# Altium footprint library Supernova Connectors.PcbLib: 303 footprints (part 11 of 19)
Each footprint in its own frame and in the unit in brackets; x right, y up, seen from the top. Pads: shape width x height; smd on the part's side, far side on the other; paste and mask are expansions set on the pad; w line width, h text height; cw(c..) or ccw(c..) is an arc to the next point about the centre after c.
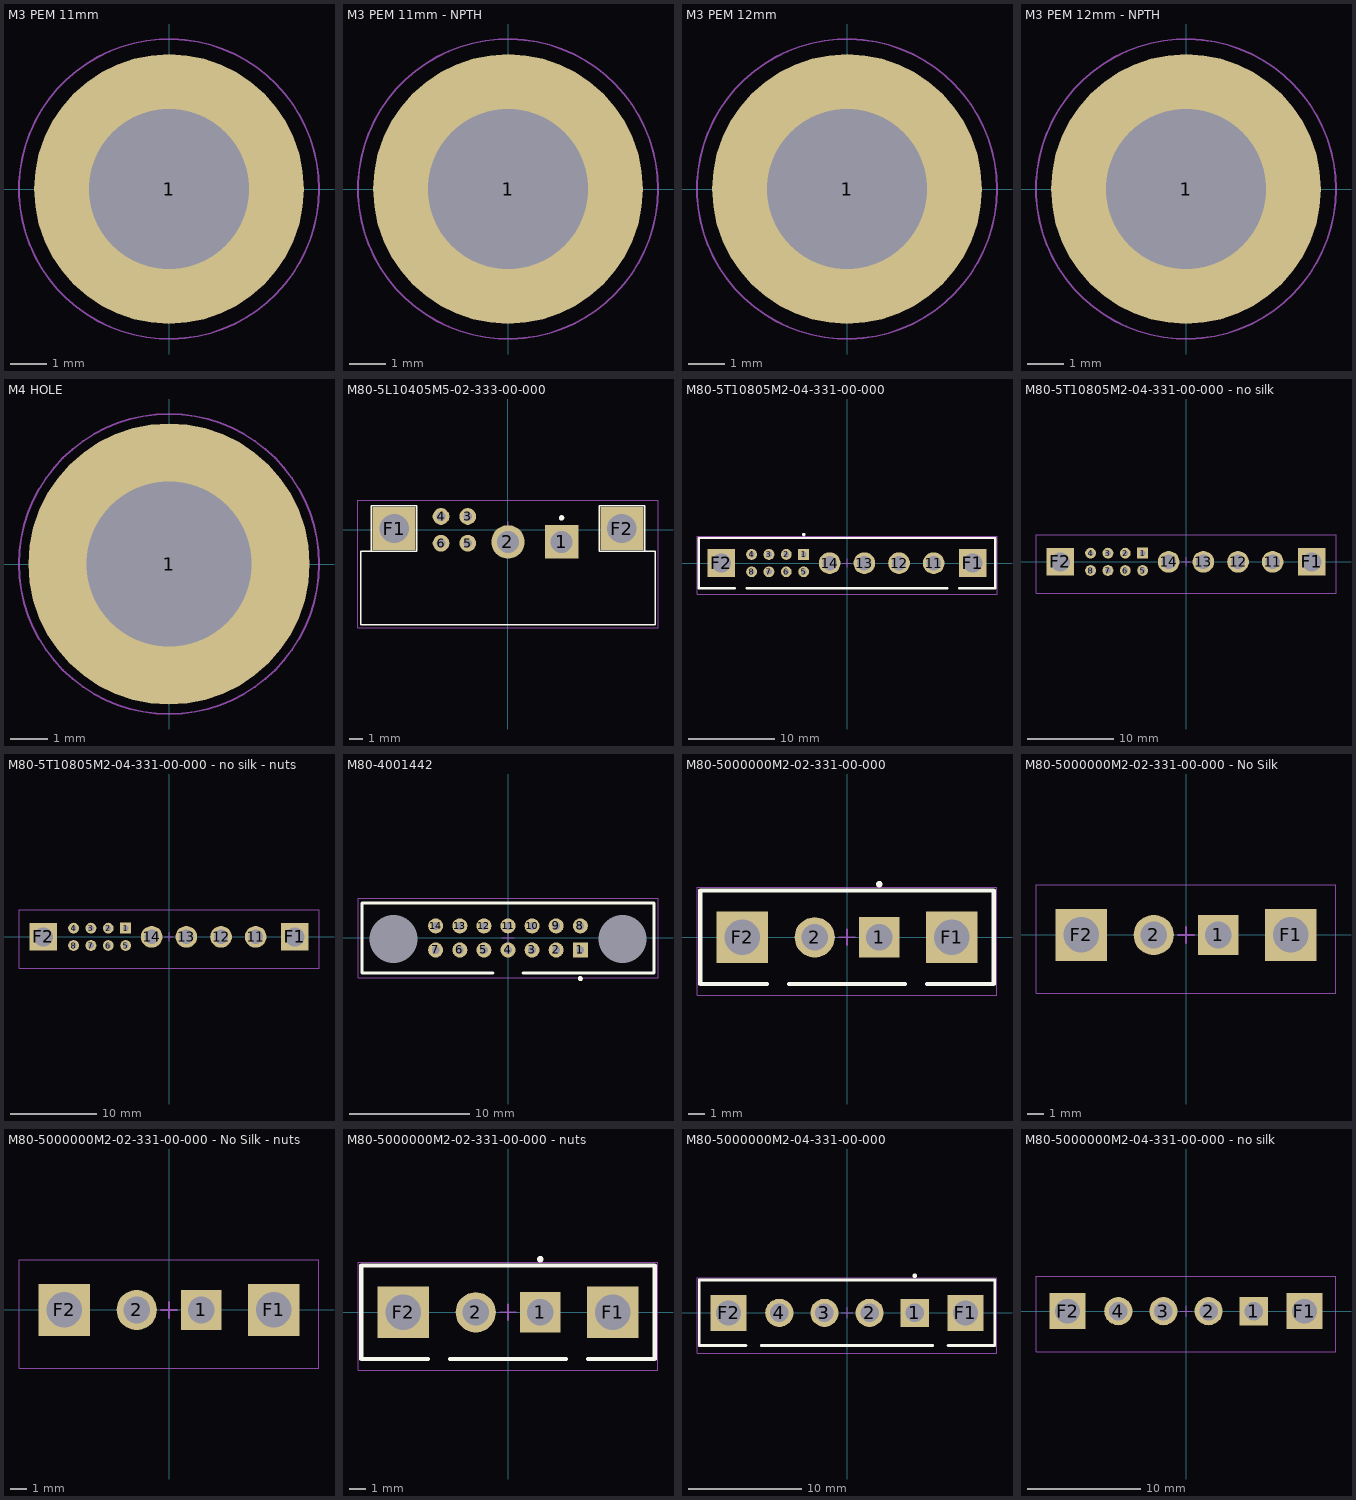
[diagram p10: the footprints below, top view; thin cyan lines are the x and y axes]

## M3 PEM 11mm [mm]
pads (1):
  round 7.4 / inner round 0 / far side round 5 hole 4.4: 1(0,0)
Top Paste:
  region: 0.4,-3.598 0.4,-2.217 0.398,-2.204 0.563,-2.168 0.884,-2.058 1.185,-1.901 1.459,-1.7 1.699,-1.46 1.9,-1.187 2.057,-0.887 2.167,-0.566 2.204,-0.4 3.613,-0.4 3.59,-0.603 3.5,-1.003 3.365,-1.389 3.188,-1.758 2.971,-2.105 2.716,-2.425 2.426,-2.715 2.106,-2.97 1.76,-3.187 1.391,-3.365 1.004,-3.5 0.605,-3.59 0.402,-3.613
  region: 3.598,0.4 2.217,0.4 2.204,0.398 2.168,0.563 2.058,0.884 1.901,1.185 1.7,1.459 1.46,1.699 1.187,1.9 0.887,2.057 0.566,2.167 0.4,2.204 0.4,3.613 0.603,3.59 1.003,3.5 1.389,3.365 1.758,3.188 2.105,2.971 2.425,2.716 2.715,2.426 2.97,2.106 3.187,1.76 3.365,1.391 3.5,1.004 3.59,0.605 3.613,0.402
  region: -0.4,3.598 -0.4,2.217 -0.398,2.204 -0.563,2.168 -0.884,2.058 -1.185,1.901 -1.459,1.7 -1.699,1.46 -1.9,1.187 -2.057,0.887 -2.167,0.566 -2.204,0.4 -3.613,0.4 -3.59,0.603 -3.5,1.003 -3.365,1.389 -3.188,1.758 -2.971,2.105 -2.716,2.425 -2.426,2.715 -2.106,2.97 -1.76,3.187 -1.391,3.365 -1.004,3.5 -0.605,3.59 -0.402,3.613
  region: -3.598,-0.4 -2.217,-0.4 -2.204,-0.398 -2.168,-0.563 -2.058,-0.884 -1.901,-1.185 -1.7,-1.459 -1.46,-1.699 -1.187,-1.9 -0.887,-2.057 -0.566,-2.167 -0.4,-2.204 -0.4,-3.613 -0.603,-3.59 -1.003,-3.5 -1.389,-3.365 -1.758,-3.188 -2.105,-2.971 -2.425,-2.716 -2.715,-2.426 -2.97,-2.106 -3.187,-1.76 -3.365,-1.391 -3.5,-1.004 -3.59,-0.605 -3.613,-0.402
Top Courtyard:
  circle w0.05: c0,0 r4.115
3D body "9774110360R (rev1).stp": height 11, standoff -1.4, extent -3,-3 3,3

## M3 PEM 11mm - NPTH [mm]
pads (1):
  round 7.4 / inner round 0 / far side round 0 hole 4.4 unplated: 1(0,0)
Top Paste:
  region: -3.598,-0.4 -2.217,-0.4 -2.204,-0.398 -2.168,-0.563 -2.058,-0.884 -1.901,-1.185 -1.7,-1.459 -1.46,-1.699 -1.187,-1.9 -0.887,-2.057 -0.566,-2.167 -0.4,-2.204 -0.4,-3.613 -0.603,-3.59 -1.003,-3.5 -1.389,-3.365 -1.758,-3.188 -2.105,-2.971 -2.425,-2.716 -2.715,-2.426 -2.97,-2.106 -3.187,-1.76 -3.365,-1.391 -3.5,-1.004 -3.59,-0.605 -3.613,-0.402
  region: -0.4,3.598 -0.4,2.217 -0.398,2.204 -0.563,2.168 -0.884,2.058 -1.185,1.901 -1.459,1.7 -1.699,1.46 -1.9,1.187 -2.057,0.887 -2.167,0.566 -2.204,0.4 -3.613,0.4 -3.59,0.603 -3.5,1.003 -3.365,1.389 -3.188,1.758 -2.971,2.105 -2.716,2.425 -2.426,2.715 -2.106,2.97 -1.76,3.187 -1.391,3.365 -1.004,3.5 -0.605,3.59 -0.402,3.613
  region: 3.598,0.4 2.217,0.4 2.204,0.398 2.168,0.563 2.058,0.884 1.901,1.185 1.7,1.459 1.46,1.699 1.187,1.9 0.887,2.057 0.566,2.167 0.4,2.204 0.4,3.613 0.603,3.59 1.003,3.5 1.389,3.365 1.758,3.188 2.105,2.971 2.425,2.716 2.715,2.426 2.97,2.106 3.187,1.76 3.365,1.391 3.5,1.004 3.59,0.605 3.613,0.402
  region: 0.4,-3.598 0.4,-2.217 0.398,-2.204 0.563,-2.168 0.884,-2.058 1.185,-1.901 1.459,-1.7 1.699,-1.46 1.9,-1.187 2.057,-0.887 2.167,-0.566 2.204,-0.4 3.613,-0.4 3.59,-0.603 3.5,-1.003 3.365,-1.389 3.188,-1.758 2.971,-2.105 2.716,-2.425 2.426,-2.715 2.106,-2.97 1.76,-3.187 1.391,-3.365 1.004,-3.5 0.605,-3.59 0.402,-3.613
Top Courtyard:
  circle w0.05: c0,0 r4.115
3D body "9774110360R (rev1).stp": height 11, standoff -1.4, extent -3,-3 3,3

## M3 PEM 12mm [mm]
pads (1):
  round 7.4 / inner round 0 / far side round 5 hole 4.4: 1(0,0)
Top Paste:
  region: 0.4,-3.598 0.4,-2.217 0.398,-2.204 0.563,-2.168 0.884,-2.058 1.185,-1.901 1.459,-1.7 1.699,-1.46 1.9,-1.187 2.057,-0.887 2.167,-0.566 2.204,-0.4 3.613,-0.4 3.59,-0.603 3.5,-1.003 3.365,-1.389 3.188,-1.758 2.971,-2.105 2.716,-2.425 2.426,-2.715 2.106,-2.97 1.76,-3.187 1.391,-3.365 1.004,-3.5 0.605,-3.59 0.402,-3.613
  region: 3.598,0.4 2.217,0.4 2.204,0.398 2.168,0.563 2.058,0.884 1.901,1.185 1.7,1.459 1.46,1.699 1.187,1.9 0.887,2.057 0.566,2.167 0.4,2.204 0.4,3.613 0.603,3.59 1.003,3.5 1.389,3.365 1.758,3.188 2.105,2.971 2.425,2.716 2.715,2.426 2.97,2.106 3.187,1.76 3.365,1.391 3.5,1.004 3.59,0.605 3.613,0.402
  region: -0.4,3.598 -0.4,2.217 -0.398,2.204 -0.563,2.168 -0.884,2.058 -1.185,1.901 -1.459,1.7 -1.699,1.46 -1.9,1.187 -2.057,0.887 -2.167,0.566 -2.204,0.4 -3.613,0.4 -3.59,0.603 -3.5,1.003 -3.365,1.389 -3.188,1.758 -2.971,2.105 -2.716,2.425 -2.426,2.715 -2.106,2.97 -1.76,3.187 -1.391,3.365 -1.004,3.5 -0.605,3.59 -0.402,3.613
  region: -3.598,-0.4 -2.217,-0.4 -2.204,-0.398 -2.168,-0.563 -2.058,-0.884 -1.901,-1.185 -1.7,-1.459 -1.46,-1.699 -1.187,-1.9 -0.887,-2.057 -0.566,-2.167 -0.4,-2.204 -0.4,-3.613 -0.603,-3.59 -1.003,-3.5 -1.389,-3.365 -1.758,-3.188 -2.105,-2.971 -2.425,-2.716 -2.715,-2.426 -2.97,-2.106 -3.187,-1.76 -3.365,-1.391 -3.5,-1.004 -3.59,-0.605 -3.613,-0.402
Top Courtyard:
  circle w0.05: c0,0 r4.115
3D body "9774120360R (rev1).stp": height 12, standoff -1.4, extent -3,-3 3,3

## M3 PEM 12mm - NPTH [mm]
pads (1):
  round 7.4 / inner round 0 / far side round 0 hole 4.4 unplated: 1(0,0)
Top Paste:
  region: -3.598,-0.4 -2.217,-0.4 -2.204,-0.398 -2.168,-0.563 -2.058,-0.884 -1.901,-1.185 -1.7,-1.459 -1.46,-1.699 -1.187,-1.9 -0.887,-2.057 -0.566,-2.167 -0.4,-2.204 -0.4,-3.613 -0.603,-3.59 -1.003,-3.5 -1.389,-3.365 -1.758,-3.188 -2.105,-2.971 -2.425,-2.716 -2.715,-2.426 -2.97,-2.106 -3.187,-1.76 -3.365,-1.391 -3.5,-1.004 -3.59,-0.605 -3.613,-0.402
  region: -0.4,3.598 -0.4,2.217 -0.398,2.204 -0.563,2.168 -0.884,2.058 -1.185,1.901 -1.459,1.7 -1.699,1.46 -1.9,1.187 -2.057,0.887 -2.167,0.566 -2.204,0.4 -3.613,0.4 -3.59,0.603 -3.5,1.003 -3.365,1.389 -3.188,1.758 -2.971,2.105 -2.716,2.425 -2.426,2.715 -2.106,2.97 -1.76,3.187 -1.391,3.365 -1.004,3.5 -0.605,3.59 -0.402,3.613
  region: 3.598,0.4 2.217,0.4 2.204,0.398 2.168,0.563 2.058,0.884 1.901,1.185 1.7,1.459 1.46,1.699 1.187,1.9 0.887,2.057 0.566,2.167 0.4,2.204 0.4,3.613 0.603,3.59 1.003,3.5 1.389,3.365 1.758,3.188 2.105,2.971 2.425,2.716 2.715,2.426 2.97,2.106 3.187,1.76 3.365,1.391 3.5,1.004 3.59,0.605 3.613,0.402
  region: 0.4,-3.598 0.4,-2.217 0.398,-2.204 0.563,-2.168 0.884,-2.058 1.185,-1.901 1.459,-1.7 1.699,-1.46 1.9,-1.187 2.057,-0.887 2.167,-0.566 2.204,-0.4 3.613,-0.4 3.59,-0.603 3.5,-1.003 3.365,-1.389 3.188,-1.758 2.971,-2.105 2.716,-2.425 2.426,-2.715 2.106,-2.97 1.76,-3.187 1.391,-3.365 1.004,-3.5 0.605,-3.59 0.402,-3.613
Top Courtyard:
  circle w0.05: c0,0 r4.115
3D body "9774120360R (rev1).stp": height 12, standoff -1.4, extent -3,-3 3,3

## M4 HOLE [mm]
pads (1):
  round 7.5 / inner round 5 / far side round 7.5 hole 4.4: 1(0,0)
Top Courtyard:
  circle w0.05: c0,0 r4

## M80-5L10405M5-02-333-00-000 [mm]
pads (8):
  rect 2.5x2.5 hole 1.65: 1(4,-0.9)
  round 2.5 hole 1.65: 2(0,-0.9)
  round 1.25 hole 0.65 paste+0: 3(-3,1) 4(-5,1) 5(-3,-1) 6(-5,-1)
  rect 3.2x3.2 / inner round 4 / far side round 4 hole 2.2 paste+0 mask+0: F1(-8.5,0.1) F2(8.5,0.1)
Top Overlay:
  circle w0.203: c4,0.895 r0.102
  lines w0.1: -10.207,-1.591 -10.207,1.787 -10.028,1.787 -6.803,1.787 -6.803,-1.591 -7.032,-1.591 -9.937,-1.591 -10.991,-1.591 -10.991,-7.1 10.991,-7.1 10.991,-1.591 9.937,-1.591 7.032,-1.591 6.803,-1.591 6.803,1.787 10.028,1.787 10.207,1.787 10.207,-1.591
Top Courtyard:
  lines w0.05: -11.2,-7.3 11.2,-7.3 11.2,2.2 -11.2,2.2 -11.2,-7.3
  lines w0.1: -0.5,0.1 0.5,0.1 ; 0,-0.4 0,0.6
3D body "m80-5l10405m5-02-333-00-000_asm.stp": height 6.05, standoff -3.67, extent -11,-7 11,2.05

## M80-5T10805M2-04-331-00-000 [mm]
pads (14):
  rect 1.25x1.25 hole 0.65 paste+0: 1(-5,1)
  round 1.25 hole 0.65 paste+0: 2(-7,1) 3(-9,1) 4(-11,1) 5(-5,-1) 6(-7,-1) 7(-9,-1) 8(-11,-1)
  round 2.5 hole 1.65: 11(10,0) 12(6,0) 13(2,0) 14(-2,0)
  rect 3.2x3.2 / inner round 4 / far side round 4 hole 2.2 paste+0 mask+0: F1(14.5,0) F2(-14.5,0)
Top Overlay:
  circle w0.203: c-5,3.295 r0.102
  lines w0.254: -12.95,-2.9 -17.1,-2.9 -17.1,2.9 17.1,2.9 17.1,-2.9 12.95,-2.9 ; -11.6,-2.9 -7.8,-2.9 ; -8,-2.9 0.2,-2.9 8.2,-2.9 ; 7.8,-2.9 11.6,-2.9
Top Courtyard:
  lines w0.05: -17.3,-3.6 -17.3,3.1 17.3,3.1 17.3,-3.6 -17.3,-3.6
  lines w0.1: -0.5,0 0.5,0 ; 0,-0.5 0,0.5
3D body "m80-5t10805m2-04-331-00-000_asm.stp": height 5.65, standoff -4.55, extent -17,-3.275 17,2.775

## M80-5T10805M2-04-331-00-000 - no silk [mm]
pads (14):
  rect 1.25x1.25 hole 0.65 paste+0: 1(-5,1)
  round 1.25 hole 0.65 paste+0: 2(-7,1) 3(-9,1) 4(-11,1) 5(-5,-1) 6(-7,-1) 7(-9,-1) 8(-11,-1)
  round 2.5 hole 1.65: 11(10,0) 12(6,0) 13(2,0) 14(-2,0)
  rect 3.2x3.2 / inner round 4 / far side round 4 hole 2.2 paste+0 mask+0: F1(14.5,0) F2(-14.5,0)
Top Courtyard:
  lines w0.05: -17.3,-3.6 -17.3,3.1 17.3,3.1 17.3,-3.6 -17.3,-3.6
  lines w0.1: -0.5,0 0.5,0 ; 0,-0.5 0,0.5
3D body "m80-5t10805m2-04-331-00-000_asm.stp": height 6.29, standoff -3.91, extent -17,-3.275 17,2.775

## M80-5T10805M2-04-331-00-000 - no silk - nuts [mm]
pads (14):
  rect 1.25x1.25 hole 0.65 paste+0: 1(-5,1)
  round 1.25 hole 0.65 paste+0: 2(-7,1) 3(-9,1) 4(-11,1) 5(-5,-1) 6(-7,-1) 7(-9,-1) 8(-11,-1)
  round 2.5 hole 1.65: 11(10,0) 12(6,0) 13(2,0) 14(-2,0)
  rect 3.2x3.2 / inner round 4 / far side round 5 hole 2.2 paste+0 mask+0: F1(14.5,0) F2(-14.5,0)
Top Courtyard:
  lines w0.05: -17.3,-3.6 -17.3,3.1 17.3,3.1 17.3,-3.6 -17.3,-3.6
  lines w0.1: -0.5,0 0.5,0 ; 0,-0.5 0,0.5
3D body "m80-5t10805m2-04-331-00-000_asm.STEP": height 6.29, standoff -2.81, extent -17,-3.275 17,2.775
3D body "94150A305_316 Stainless Steel Hex Nut.STEP": height 1.6, standoff 0, extent 12.5,-2.309 16.5,2.309
3D body "94150A305_316 Stainless Steel Hex Nut.STEP": height 1.6, standoff 0, extent -16.5,-2.309 -12.5,2.309

## M80-4001442 [mm]
pads (16):
  rect 1.25x1.25 hole 0.65 paste+0: 1(6,-1)
  round 1.25 hole 0.65 paste+0: 2(4,-1) 3(2,-1) 4(0,-1) 5(-2,-1) 6(-4,-1) 7(-6,-1) 8(6,1) 9(4,1) 10(2,1) 11(0,1) 12(-2,1) 13(-4,1) 14(-6,1)
  round 3.5 hole 4 unplated paste+0 mask+0: ""(-9.5,-0.1)
  oval 3.5x3.2 hole 4 unplated paste+0 mask+0: ""(9.5,-0.1)
Top Overlay:
  circle w0.203: c6,-3.378 r0.102
  lines w0.254: -1.25,-2.9 -12.1,-2.9 -12.1,2.9 -6.6,2.9 -1.925,2.9 6.6,2.9 12.1,2.9 12.1,-2.9 1.25,-2.9
Top Courtyard:
  lines w0.05: -12.446,-3.302 -12.446,3.302 12.446,3.302 12.446,-3.302 -12.446,-3.302
  lines w0.1: -0.5,0 0.5,0 ; 0,-0.5 0,0.5
3D body "m80-4001442_asm.stp": height 5.5, standoff -3, extent -12,-2.784 12,2.766

## M80-5000000M2-02-331-00-000 [mm]
pads (4):
  rect 2.5x2.5 hole 1.65: 1(2,0)
  round 2.5 hole 1.65: 2(-2,0)
  rect 3.2x3.2 / inner round 4 / far side round 4 hole 2.2 paste+0 mask+0: F1(6.5,0) F2(-6.5,0)
Top Overlay:
  circle w0.203: c2,3.295 r0.102
  lines w0.254: -4.95,-2.9 -9.1,-2.9 -9.1,2.9 9.1,2.9 9.1,-2.9 4.95,-2.9 ; -3.6,-2.9 0.2,-2.9 ; -0.2,-2.9 3.6,-2.9
Top Courtyard:
  lines w0.05: -9.3,-3.6 9.3,-3.6 9.3,3.1 -9.3,3.1 -9.3,-3.6
  lines w0.1: -0.5,0 0.5,0 ; 0,-0.5 0,0.5
3D body "m80-5000000m2-02-331-00-000_asm.stp": height 5.65, standoff -3.95, extent -9,-3.275 9,2.775

## M80-5000000M2-02-331-00-000 - No Silk [mm]
pads (4):
  rect 2.5x2.5 hole 1.65: 1(2,0)
  round 2.5 hole 1.65: 2(-2,0)
  rect 3.2x3.2 / inner round 4 / far side round 4 hole 2.2 paste+0 mask+0: F1(6.5,0) F2(-6.5,0)
Top Courtyard:
  lines w0.05: -9.3,-3.6 -9.3,3.1 9.3,3.1 9.3,-3.6 -9.3,-3.6
  lines w0.1: -0.5,0 0.5,0 ; 0,-0.5 0,0.5
3D body "m80-5000000m2-02-331-00-000_asm.stp": height 6.29, standoff -3.31, extent -9,-3.275 9,2.775

## M80-5000000M2-02-331-00-000 - No Silk - nuts [mm]
pads (4):
  rect 2.5x2.5 hole 1.65: 1(2,0)
  round 2.5 hole 1.65: 2(-2,0)
  rect 3.2x3.2 / inner round 4 / far side round 5 hole 2.2 paste+0 mask+0: F1(6.5,0) F2(-6.5,0)
Top Courtyard:
  lines w0.05: -9.3,-3.6 -9.3,3.1 9.3,3.1 9.3,-3.6 -9.3,-3.6
  lines w0.1: -0.5,0 0.5,0 ; 0,-0.5 0,0.5
3D body "m80-5000000m2-02-331-00-000_asm.stp.STEP": height 6.29, standoff -2.81, extent -9,-3.275 9,2.775
3D body "94150A305_316 Stainless Steel Hex Nut.STEP": height 1.6, standoff 0, extent -8.5,-2.309 -4.5,2.309
3D body "94150A305_316 Stainless Steel Hex Nut.STEP": height 1.6, standoff 0, extent 4.5,-2.309 8.5,2.309

## M80-5000000M2-02-331-00-000 - nuts [mm]
pads (4):
  rect 2.5x2.5 hole 1.65: 1(2,0)
  round 2.5 hole 1.65: 2(-2,0)
  rect 3.2x3.2 / inner round 4 / far side round 5 hole 2.2 paste+0 mask+0: F1(6.5,0) F2(-6.5,0)
Top Overlay:
  circle w0.203: c2,3.295 r0.102
  lines w0.254: -4.95,-2.9 -9.1,-2.9 -9.1,2.9 9.1,2.9 9.1,-2.9 4.95,-2.9 ; -3.6,-2.9 0.2,-2.9 ; -0.2,-2.9 3.6,-2.9
Top Courtyard:
  lines w0.05: -9.3,-3.6 -9.3,3.1 9.3,3.1 9.3,-3.6 -9.3,-3.6
  lines w0.1: -0.5,0 0.5,0 ; 0,-0.5 0,0.5
3D body "m80-5000000m2-02-331-00-000_asm.stp.STEP": height 5.65, standoff -3.45, extent -9,-3.275 9,2.775
3D body "94150A305_316 Stainless Steel Hex Nut.STEP": height 1.6, standoff 0, extent -8.5,-2.309 -4.5,2.309
3D body "94150A305_316 Stainless Steel Hex Nut.STEP": height 1.6, standoff 0, extent 4.5,-2.309 8.5,2.309

## M80-5000000M2-04-331-00-000 [mm]
pads (6):
  rect 2.5x2.5 hole 1.65: 1(6,0)
  round 2.5 hole 1.65: 2(2,0) 3(-2,0) 4(-6,0)
  rect 3.2x3.2 / inner round 4 / far side round 4 hole 2.2 paste+0 mask+0: F1(10.5,0) F2(-10.5,0)
Top Overlay:
  circle w0.203: c6,3.295 r0.102
  lines w0.254: -8.95,-2.9 -13.1,-2.9 -13.1,2.9 13.1,2.9 13.1,-2.9 8.95,-2.9 ; -7.6,-2.9 -3.8,-2.9 4.2,-2.9 ; 3.8,-2.9 7.6,-2.9
Top Courtyard:
  lines w0.05: -13.3,-3.6 13.3,-3.6 13.3,3.1 -13.3,3.1 -13.3,-3.6
  lines w0.1: -0.5,0 0.5,0 ; 0,-0.5 0,0.5
3D body "m80-5000000m2-04-331-00-000_asm.stp": height 5.65, standoff -4.55, extent -13,-3.275 13,2.775

## M80-5000000M2-04-331-00-000 - no silk [mm]
pads (6):
  rect 2.5x2.5 hole 1.65: 1(6,0)
  round 2.5 hole 1.65: 2(2,0) 3(-2,0) 4(-6,0)
  rect 3.2x3.2 / inner round 4 / far side round 4 hole 2.2 paste+0 mask+0: F1(10.5,0) F2(-10.5,0)
Top Courtyard:
  lines w0.05: -13.3,-3.6 -13.3,3.1 13.3,3.1 13.3,-3.6 -13.3,-3.6
  lines w0.1: -0.5,0 0.5,0 ; 0,-0.5 0,0.5
3D body "m80-5000000m2-04-331-00-000_asm.stp": height 6.29, standoff -3.91, extent -13,-3.275 13,2.775